# Altium footprint library goldpin_female_pcb.PcbLib: 81 footprints (part 5 of 6)
Each footprint in its own frame and in the unit in brackets; x right, y up, seen from the top. Pads: shape width x height; smd on the part's side, far side on the other; paste and mask are expansions set on the pad; w line width, h text height; cw(c..) or ccw(c..) is an arc to the next point about the centre after c.
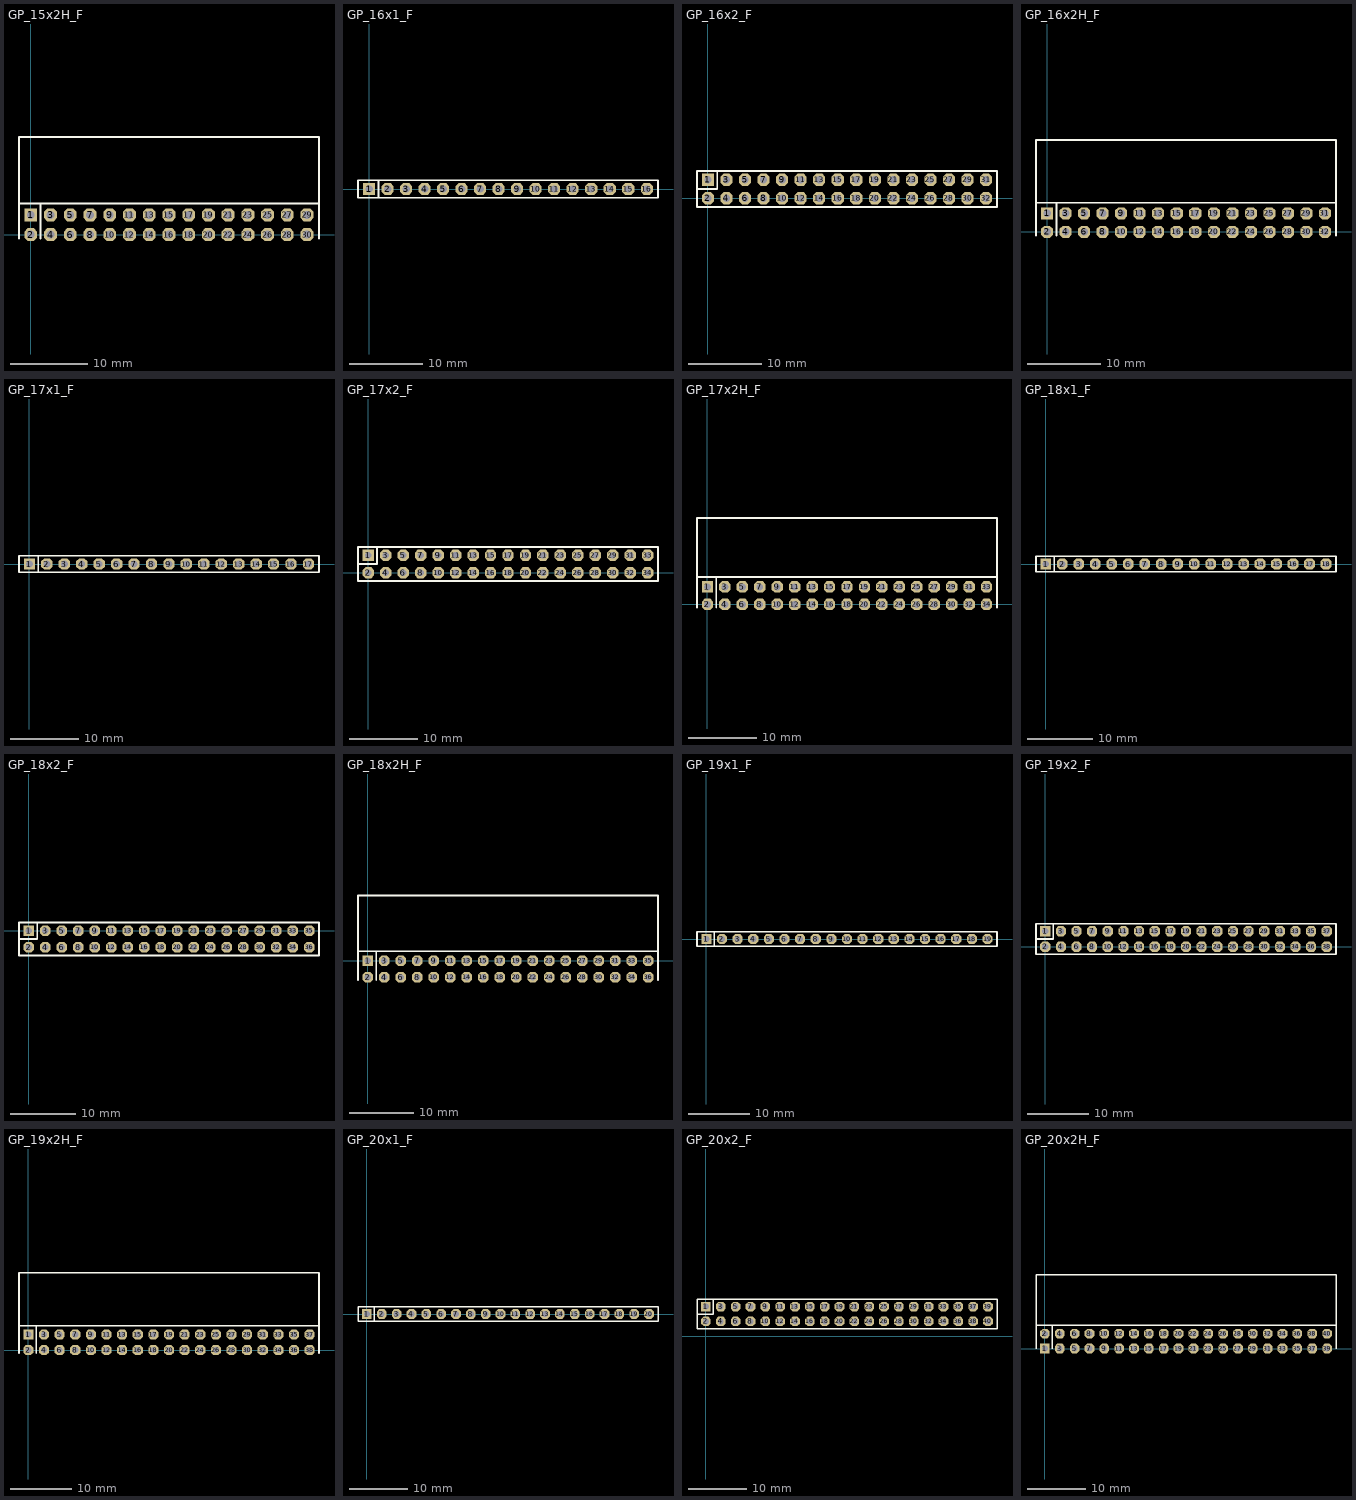
[diagram p4: the footprints below, top view; thin cyan lines are the x and y axes]

## GP_15x2H_F [mil]
pads (30):
  rect 65x65 hole 39.37: 1(0,100)
  oct 65x65 hole 39.37: 2(0,0) 3(100,100) 4(100,0) 5(200,100) 6(200,0) 7(300,100) 8(300,0) 9(400,100) 10(400,0) 11(500,100) 12(500,0) 13(600,100) 14(600,0) 15(700,100) 16(700,0) 17(800,100) 18(800,0) 19(900,100) 20(900,0) 21(1000,100) 22(1000,0) 23(1100,100) 24(1100,0) 25(1200,100) 26(1200,0) 27(1300,100) 28(1300,0) 29(1400,100) 30(1400,0)
Top Overlay:
  lines w10: -60,-20 -60,495 1460,495 1460,-20 ; -60,157.24 1460.63,157.24 ; 50,-20 50,157.24
3D body "Samtec-SSW-115-22-G-D-RA.step": height 197.89, standoff -97.11, extent -59.06,-11.81 1460.94,491.19

## GP_16x1_F [mil]
pads (16):
  rect 65x65 hole 39.37: 1(0,0)
  oct 65x65 hole 39.37: 2(100,0) 3(200,0) 4(300,0) 5(400,0) 6(500,0) 7(600,0) 8(700,0) 9(800,0) 10(900,0) 11(1000,0) 12(1100,0) 13(1200,0) 14(1300,0) 15(1400,0) 16(1500,0)
Top Overlay:
  lines w10: 50,-47.24 50,45 ; -60,-47.24 1560.63,-47.24 1560.63,47.24 -60,47.24 -60,-47.24
3D body "Samtec-SSW-116-01-G-S.step": height 335, standoff -104, extent -60,-47.5 1560,47.5

## GP_16x2_F [mil]
pads (32):
  rect 65x65 hole 39.37: 1(0,100)
  oct 65x65 hole 39.37: 2(0,0) 3(100,100) 4(100,0) 5(200,100) 6(200,0) 7(300,100) 8(300,0) 9(400,100) 10(400,0) 11(500,100) 12(500,0) 13(600,100) 14(600,0) 15(700,100) 16(700,0) 17(800,100) 18(800,0) 19(900,100) 20(900,0) 21(1000,100) 22(1000,0) 23(1100,100) 24(1100,0) 25(1200,100) 26(1200,0) 27(1300,100) 28(1300,0) 29(1400,100) 30(1400,0) 31(1500,100) 32(1500,0)
Top Overlay:
  lines w10: -59.06,50 50,50 50,147.51 ; -59.06,-47.49 1559.06,-47.49 1559.06,147.49 -59.06,147.51 -59.06,-47.49
3D body "Samtec-SSW-116-01-G-D.step": height 335, standoff -104, extent -60,-47.49 1560,147.51

## GP_16x2H_F [mil]
pads (32):
  rect 65x65 hole 39.37: 1(0,100)
  oct 65x65 hole 39.37: 2(0,0) 3(100,100) 4(100,0) 5(200,100) 6(200,0) 7(300,100) 8(300,0) 9(400,100) 10(400,0) 11(500,100) 12(500,0) 13(600,100) 14(600,0) 15(700,100) 16(700,0) 17(800,100) 18(800,0) 19(900,100) 20(900,0) 21(1000,100) 22(1000,0) 23(1100,100) 24(1100,0) 25(1200,100) 26(1200,0) 27(1300,100) 28(1300,0) 29(1400,100) 30(1400,0) 31(1500,100) 32(1500,0)
Top Overlay:
  lines w10: -60,-20 -60,495 1560,495 1560,-20 ; -60,157.24 1560,157.24 ; 50,-20 50,157.24
3D body "Samtec-SSW-116-22-G-D-RA.step": height 197.89, standoff -97.11, extent -59.06,-11.81 1560.94,491.19

## GP_17x1_F [mil]
pads (17):
  rect 65x65 hole 39.37: 1(0,0)
  oct 65x65 hole 39.37: 2(100,0) 3(200,0) 4(300,0) 5(400,0) 6(500,0) 7(600,0) 8(700,0) 9(800,0) 10(900,0) 11(1000,0) 12(1100,0) 13(1200,0) 14(1300,0) 15(1400,0) 16(1500,0) 17(1600,0)
Top Overlay:
  lines w10: 50,-47.24 50,45 ; -60,-47.24 -60,47.24 1660.63,47.24 1660.63,-47.24 -60,-47.24
3D body "Samtec-SSW-117-01-G-S.step": height 335, standoff -104, extent -60,-47.5 1660,47.5

## GP_17x2_F [mil]
pads (34):
  rect 65x65 hole 39.37: 1(0,100)
  oct 65x65 hole 39.37: 2(0,0) 3(100,100) 4(100,0) 5(200,100) 6(200,0) 7(300,100) 8(300,0) 9(400,100) 10(400,0) 11(500,100) 12(500,0) 13(600,100) 14(600,0) 15(700,100) 16(700,0) 17(800,100) 18(800,0) 19(900,100) 20(900,0) 21(1000,100) 22(1000,0) 23(1100,100) 24(1100,0) 25(1200,100) 26(1200,0) 27(1300,100) 28(1300,0) 29(1400,100) 30(1400,0) 31(1500,100) 32(1500,0) 33(1600,100) 34(1600,0)
Top Overlay:
  lines w10: -59.06,50 50,50 50,147.51 ; -59.06,-47.49 -59.06,147.51 1659.06,147.51 1659.06,-47.51 -59.06,-47.49
3D body "Samtec-SSW-117-01-G-D.step": height 335, standoff -104, extent -60,-47.49 1660,147.51

## GP_17x2H_F [mil]
pads (34):
  rect 65x65 hole 39.37: 1(0,100)
  oct 65x65 hole 39.37: 2(0,0) 3(100,100) 4(100,0) 5(200,100) 6(200,0) 7(300,100) 8(300,0) 9(400,100) 10(400,0) 11(500,100) 12(500,0) 13(600,100) 14(600,0) 15(700,100) 16(700,0) 17(800,100) 18(800,0) 19(900,100) 20(900,0) 21(1000,100) 22(1000,0) 23(1100,100) 24(1100,0) 25(1200,100) 26(1200,0) 27(1300,100) 28(1300,0) 29(1400,100) 30(1400,0) 31(1500,100) 32(1500,0) 33(1600,100) 34(1600,0)
Top Overlay:
  lines w10: -60,-20 -60,495 1660,495 1660,-20 ; -60,157.24 1660,157.24 ; 50,-20 50,157.24
3D body "Samtec-SSW-117-22-G-D-RA.step": height 197.89, standoff -97.11, extent -59.06,-11.81 1660.94,491.19

## GP_18x1_F [mil]
pads (18):
  rect 65x65 hole 39.37: 1(0,0)
  oct 65x65 hole 39.37: 2(100,0) 3(200,0) 4(300,0) 5(400,0) 6(500,0) 7(600,0) 8(700,0) 9(800,0) 10(900,0) 11(1000,0) 12(1100,0) 13(1200,0) 14(1300,0) 15(1400,0) 16(1500,0) 17(1600,0) 18(1700,0)
Top Overlay:
  lines w10: 50,-47.24 50,45 ; -60,-47.24 1760.63,-47.24 1760.63,47.24 -60,47.24 -60,-47.24
3D body "Samtec-SSW-118-01-G-S.step": height 335, standoff -104, extent -60,-47.5 1760,47.5

## GP_18x2_F [mil]
pads (36):
  rect 65x65 hole 39.37: 1(0,0)
  oct 65x65 hole 39.37: 2(0,-100) 3(100,0) 4(100,-100) 5(200,0) 6(200,-100) 7(300,0) 8(300,-100) 9(400,0) 10(400,-100) 11(500,0) 12(500,-100) 13(600,0) 14(600,-100) 15(700,0) 16(700,-100) 17(800,0) 18(800,-100) 19(900,0) 20(900,-100) 21(1000,0) 22(1000,-100) 23(1100,0) 24(1100,-100) 25(1200,0) 26(1200,-100) 27(1300,0) 28(1300,-100) 29(1400,0) 30(1400,-100) 31(1500,0) 32(1500,-100) 33(1600,0) 34(1600,-100) 35(1700,0) 36(1700,-100)
Top Overlay:
  lines w10: -60,-50.39 50,-50.39 50,48.03 ; -60,-150 -60,50 1759.84,50 1759.84,-150 -60,-150
3D body "Samtec-SSW-118-01-G-D.step": height 335, standoff -104, extent -60,-147.89 1760,47.11

## GP_18x2H_F [mil]
pads (36):
  rect 65x65 hole 39.37: 1(0,0)
  oct 65x65 hole 39.37: 2(0,-100) 3(100,0) 4(100,-100) 5(200,0) 6(200,-100) 7(300,0) 8(300,-100) 9(400,0) 10(400,-100) 11(500,0) 12(500,-100) 13(600,0) 14(600,-100) 15(700,0) 16(700,-100) 17(800,0) 18(800,-100) 19(900,0) 20(900,-100) 21(1000,0) 22(1000,-100) 23(1100,0) 24(1100,-100) 25(1200,0) 26(1200,-100) 27(1300,0) 28(1300,-100) 29(1400,0) 30(1400,-100) 31(1500,0) 32(1500,-100) 33(1600,0) 34(1600,-100) 35(1700,0) 36(1700,-100)
Top Overlay:
  lines w10: -60,-120 -60,395 1760,395 1760,-120 ; -60,57.24 1760,57.24 ; 50,-120 50,57.24
3D body "Samtec-SSW-118-22-G-D-RA.step": height 197.89, standoff -97.11, extent -59.06,-111.81 1760.94,391.19

## GP_19x1_F [mil]
pads (19):
  rect 65x65 hole 39.37: 1(0,0)
  oct 65x65 hole 39.37: 2(100,0) 3(200,0) 4(300,0) 5(400,0) 6(500,0) 7(600,0) 8(700,0) 9(800,0) 10(900,0) 11(1000,0) 12(1100,0) 13(1200,0) 14(1300,0) 15(1400,0) 16(1500,0) 17(1600,0) 18(1700,0) 19(1800,0)
Top Overlay:
  lines w10: 50,-47.24 50,45 ; -60,-47.24 -60,47.24 1860.63,47.24 1860.63,-47.24 -60,-47.24
3D body "Samtec-SSW-119-01-G-S.step": height 335, standoff -104, extent -60,-47.5 1860,47.5

## GP_19x2_F [mil]
pads (38):
  rect 65x65 hole 39.37: 1(0,100)
  oct 65x65 hole 39.37: 2(0,0) 3(100,100) 4(100,0) 5(200,100) 6(200,0) 7(300,100) 8(300,0) 9(400,100) 10(400,0) 11(500,100) 12(500,0) 13(600,100) 14(600,0) 15(700,100) 16(700,0) 17(800,100) 18(800,0) 19(900,100) 20(900,0) 21(1000,100) 22(1000,0) 23(1100,100) 24(1100,0) 25(1200,100) 26(1200,0) 27(1300,100) 28(1300,0) 29(1400,100) 30(1400,0) 31(1500,100) 32(1500,0) 33(1600,100) 34(1600,0) 35(1700,100) 36(1700,0) 37(1800,100) 38(1800,0)
Top Overlay:
  lines w10: -59.06,50 50,50 50,147.51 ; -59.06,-47.49 1859.06,-47.49 1859.06,147.49 -59.06,147.51 -59.06,-47.49
3D body "Samtec-SSW-119-01-G-D.step": height 335, standoff -104, extent -60,-47.49 1860,147.51

## GP_19x2H_F [mil]
pads (38):
  rect 65x65 hole 39.37: 1(0,100)
  oct 65x65 hole 39.37: 2(0,0) 3(100,100) 4(100,0) 5(200,100) 6(200,0) 7(300,100) 8(300,0) 9(400,100) 10(400,0) 11(500,100) 12(500,0) 13(600,100) 14(600,0) 15(700,100) 16(700,0) 17(800,100) 18(800,0) 19(900,100) 20(900,0) 21(1000,100) 22(1000,0) 23(1100,100) 24(1100,0) 25(1200,100) 26(1200,0) 27(1300,100) 28(1300,0) 29(1400,100) 30(1400,0) 31(1500,100) 32(1500,0) 33(1600,100) 34(1600,0) 35(1700,100) 36(1700,0) 37(1800,100) 38(1800,0)
Top Overlay:
  lines w10: -60,-20 -60,495 1860,495 1860,-20 ; -60,157.24 1860,157.24 ; 50,-20 50,157.24
3D body "Samtec-SSW-119-22-G-D-RA.step": height 197.89, standoff -97.11, extent -59.06,-11.81 1860.94,491.19

## GP_20x1_F [mil]
pads (20):
  rect 65x65 hole 39.37: 1(0,0)
  oct 65x65 hole 39.37: 2(100,0) 3(200,0) 4(300,0) 5(400,0) 6(500,0) 7(600,0) 8(700,0) 9(800,0) 10(900,0) 11(1000,0) 12(1100,0) 13(1200,0) 14(1300,0) 15(1400,0) 16(1500,0) 17(1600,0) 18(1700,0) 19(1800,0) 20(1900,0)
Top Overlay:
  lines w10: 50,-47.24 50,45 ; -60,-47.24 1960.63,-47.24 1960.63,47.24 -60,47.24 -60,-47.24
3D body "Samtec-SSW-120-01-G-S.step": height 335, standoff -104, extent -60,-47.5 1960,47.5

## GP_20x2_F [mil]
pads (40):
  rect 65x65 hole 39.37: 1(0,200)
  oct 65x65 hole 39.37: 2(0,100) 3(100,200) 4(100,100) 5(200,200) 6(200,100) 7(300,200) 8(300,100) 9(400,200) 10(400,100) 11(500,200) 12(500,100) 13(600,200) 14(600,100) 15(700,200) 16(700,100) 17(800,200) 18(800,100) 19(900,200) 20(900,100) 21(1000,200) 22(1000,100) 23(1100,200) 24(1100,100) 25(1200,200) 26(1200,100) 27(1300,200) 28(1300,100) 29(1400,200) 30(1400,100) 31(1500,200) 32(1500,100) 33(1600,200) 34(1600,100) 35(1700,200) 36(1700,100) 37(1800,200) 38(1800,100) 39(1900,200) 40(1900,100)
Top Overlay:
  lines w10: -60,149.61 50,149.61 50,248.03 ; -60,50 1960.63,50 1960.63,250 -60,250 -60,50
3D body "Samtec-SSW-120-01-G-D.step": height 335, standoff -104, extent -60,52.11 1960,247.11

## GP_20x2H_F [mil]
pads (40):
  rect 65x65 hole 39.37: 1(0,0)
  oct 65x65 hole 39.37: 2(0,100) 3(100,0) 4(100,100) 5(200,0) 6(200,100) 7(300,0) 8(300,100) 9(400,0) 10(400,100) 11(500,0) 12(500,100) 13(600,0) 14(600,100) 15(700,0) 16(700,100) 17(800,0) 18(800,100) 19(900,0) 20(900,100) 21(1000,0) 22(1000,100) 23(1100,0) 24(1100,100) 25(1200,0) 26(1200,100) 27(1300,0) 28(1300,100) 29(1400,0) 30(1400,100) 31(1500,0) 32(1500,100) 33(1600,0) 34(1600,100) 35(1700,0) 36(1700,100) 37(1800,0) 38(1800,100) 39(1900,0) 40(1900,100)
Top Overlay:
  lines w10: -60,0 -60,190.31 -60,497.64 1960,497.64 1960,0 ; -60,157.24 1956.69,157.24 ; 50,0 50,155
3D body "Samtec-SSW-120-22-G-D-RA.step": height 197.89, standoff -97.11, extent -59.99,-8 1960.01,495